# Altium schematic symbol library jlcpcb_2025_04_capacitors_extended_0402.schlib: 3594 symbols (part 4 of 20)
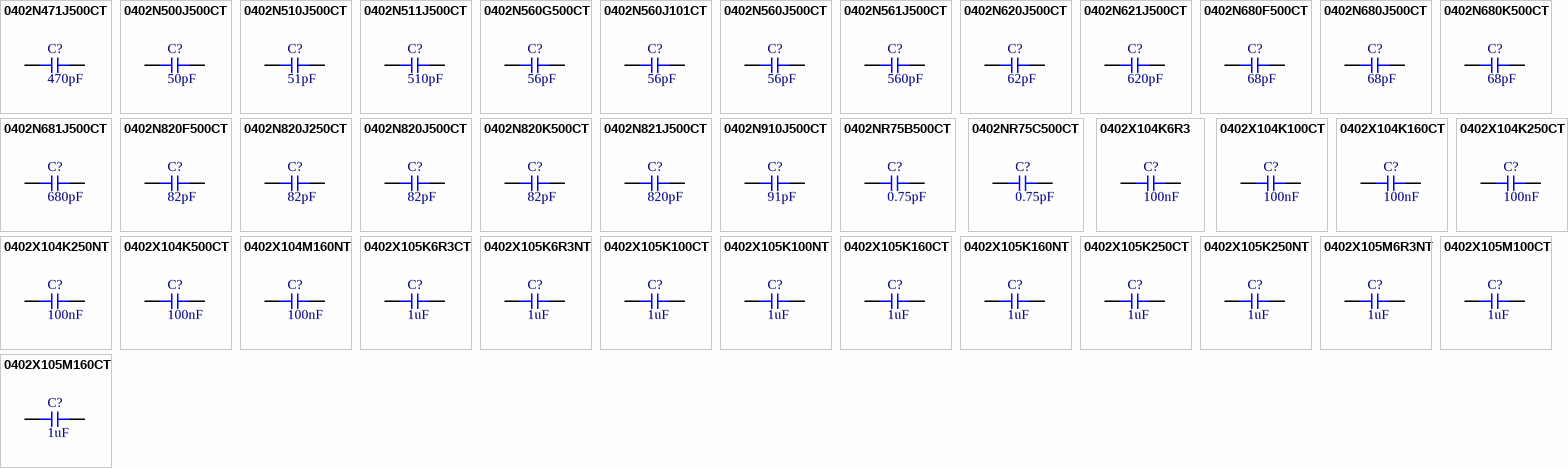
[diagram p92: symbols 0402N471J500CT to 0402X105M160CT]

## 0402X104M160NT
designator C?  Capacitance: 100nF  (hidden comment: *)
Capacitor, Ceramic (MLCC), 100nF, 16V, X5R, SMD 0402; Manufacturer: FH (Guangdong Fenghua Advanced Tech); Manufacturer Part Number: 0402X104M160NT; Package Size: 0402; JLCPCB Basic Part: No; JLCPCB Part Number: C2857973; Supplier 1: LCSC; Category: Capacitors - MLCC; Supplier Part Number 1: C2857973; Voltage Rating: 16V; Temperature Coefficient: X5R; RoHS: Yes; ComponentLink1Description: Datasheet; ComponentLink2Description: JLCPCB Part URL; ComponentLink2URL: https://jlcpcb.com/partdetail/C2857973; ComponentLink3Description: LCSC Part URL; ComponentLink3URL: https://lcsc.com/product-detail/Multilayer-Ceramic-Capacitors-MLCC---SMD-SMT_FH-Guangdong-Fenghua-Advanced-Tech-FH-Guangdong-Fenghua-Advanced-Tech-0402X104M160NT_C2857973.html
footprint CAP-0402 (0402 (1005M) Capacitor)
pins: 1, 2

## 0402X105K6R3CT
designator C?  Capacitance: 1uF  (hidden comment: *)
Capacitor, Ceramic (MLCC), 1uF, ±10%, 6.3V, X5R, ±10%, SMD 0402; Manufacturer: Walsin Tech Corp; Manufacturer Part Number: 0402X105K6R3CT; Package Size: 0402; JLCPCB Basic Part: No; JLCPCB Part Number: C295938; Supplier 1: LCSC; Category: Capacitors - MLCC; Supplier Part Number 1: C295938; Tolerance: ±10%; Voltage Rating: 6.3V; Temperature Coefficient: X5R; RoHS: Yes; ComponentLink1Description: Datasheet; ComponentLink1URL: https://wmsc.lcsc.com/wmsc/upload/file/pdf/v2/lcsc/2304140030_Walsin-Tech-Corp-0402X105K6R3CT_C295938.pdf; ComponentLink2Description: JLCPCB Part URL; ComponentLink2URL: https://jlcpcb.com/partdetail/C295938; ComponentLink3Description: LCSC Part URL; ComponentLink3URL: https://lcsc.com/product-detail/Multilayer-Ceramic-Capacitors-MLCC---SMD-SMT_Walsin-Tech-Corp-Walsin-Tech-Corp-0402X105K6R3CT_C295938.html
footprint CAP-0402 (0402 (1005M) Capacitor)
pins: 1, 2

## 0402X105K6R3NT
designator C?  Capacitance: 1uF  (hidden comment: *)
Capacitor, Ceramic (MLCC), 1uF, ±10%, 6.3V, X5R, ±10%, SMD 0402; Manufacturer: FH(Guangdong Fenghua Advanced Tech); Manufacturer Part Number: 0402X105K6R3NT; Package Size: 0402; JLCPCB Basic Part: No; JLCPCB Part Number: C142376; Supplier 1: LCSC; Category: Capacitors - MLCC; Supplier Part Number 1: C142376; Tolerance: ±10%; Voltage Rating: 6.3V; Temperature Coefficient: X5R; RoHS: Yes; ComponentLink1Description: Datasheet; ComponentLink1URL: https://wmsc.lcsc.com/wmsc/upload/file/pdf/v2/lcsc/2304140030_FH--Guangdong-Fenghua-Advanced-Tech-0402X105K6R3NT_C142376.pdf; ComponentLink2Description: JLCPCB Part URL; ComponentLink2URL: https://jlcpcb.com/partdetail/C142376; ComponentLink3Description: LCSC Part URL; ComponentLink3URL: https://lcsc.com/product-detail/Multilayer-Ceramic-Capacitors-MLCC---SMD-SMT_FH-Guangdong-Fenghua-Advanced-Tech-FH-Guangdong-Fenghua-Advanced-Tech-0402X105K6R3NT_C142376.html
footprint CAP-0402 (0402 (1005M) Capacitor)
pins: 1, 2

## 0402X105K100CT
designator C?  Capacitance: 1uF  (hidden comment: *)
Capacitor, Ceramic (MLCC), 1uF, ±10%, 10V, X5R, ±10%, SMD 0402; Manufacturer: Walsin Tech Corp; Manufacturer Part Number: 0402X105K100CT; Package Size: 0402; JLCPCB Basic Part: No; JLCPCB Part Number: C164868; Supplier 1: LCSC; Category: Capacitors - MLCC; Supplier Part Number 1: C164868; Tolerance: ±10%; Voltage Rating: 10V; Temperature Coefficient: X5R; RoHS: Yes; ComponentLink1Description: Datasheet; ComponentLink1URL: https://wmsc.lcsc.com/wmsc/upload/file/pdf/v2/lcsc/2304140030_Walsin-Tech-Corp-0402X105K100CT_C164868.pdf; ComponentLink2Description: JLCPCB Part URL; ComponentLink2URL: https://jlcpcb.com/partdetail/C164868; ComponentLink3Description: LCSC Part URL; ComponentLink3URL: https://lcsc.com/product-detail/Multilayer-Ceramic-Capacitors-MLCC---SMD-SMT_Walsin-Tech-Corp-Walsin-Tech-Corp-0402X105K100CT_C164868.html
footprint CAP-0402 (0402 (1005M) Capacitor)
pins: 1, 2

## 0402X105K100NT
designator C?  Capacitance: 1uF  (hidden comment: *)
Capacitor, Ceramic (MLCC), 1uF, ±10%, 10V, X5R, ±10%, SMD 0402; Manufacturer: FH(Guangdong Fenghua Advanced Tech); Manufacturer Part Number: 0402X105K100NT; Package Size: 0402; JLCPCB Basic Part: No; JLCPCB Part Number: C157353; Supplier 1: LCSC; Category: Capacitors - MLCC; Supplier Part Number 1: C157353; Tolerance: ±10%; Voltage Rating: 10V; Temperature Coefficient: X5R; RoHS: Yes; ComponentLink1Description: Datasheet; ComponentLink1URL: https://wmsc.lcsc.com/wmsc/upload/file/pdf/v2/lcsc/2304140030_FH--Guangdong-Fenghua-Advanced-Tech-0402X105K100NT_C157353.pdf; ComponentLink2Description: JLCPCB Part URL; ComponentLink2URL: https://jlcpcb.com/partdetail/C157353; ComponentLink3Description: LCSC Part URL; ComponentLink3URL: https://lcsc.com/product-detail/Multilayer-Ceramic-Capacitors-MLCC---SMD-SMT_FH-Guangdong-Fenghua-Advanced-Tech-FH-Guangdong-Fenghua-Advanced-Tech-0402X105K100NT_C157353.html
footprint CAP-0402 (0402 (1005M) Capacitor)
pins: 1, 2

## 0402X105K160CT
designator C?  Capacitance: 1uF  (hidden comment: *)
Capacitor, Ceramic (MLCC), 1uF, ±10%, 16V, X5R, ±10%, SMD 0402; Manufacturer: Walsin Tech Corp; Manufacturer Part Number: 0402X105K160CT; Package Size: 0402; JLCPCB Basic Part: No; JLCPCB Part Number: C83063; Supplier 1: LCSC; Category: Capacitors - MLCC; Supplier Part Number 1: C83063; Tolerance: ±10%; Voltage Rating: 16V; Temperature Coefficient: X5R; RoHS: Yes; ComponentLink1Description: Datasheet; ComponentLink1URL: https://wmsc.lcsc.com/wmsc/upload/file/pdf/v2/lcsc/2304140030_Walsin-Tech-Corp-0402X105K160CT_C83063.pdf; ComponentLink2Description: JLCPCB Part URL; ComponentLink2URL: https://jlcpcb.com/partdetail/C83063; ComponentLink3Description: LCSC Part URL; ComponentLink3URL: https://lcsc.com/product-detail/Multilayer-Ceramic-Capacitors-MLCC---SMD-SMT_Walsin-Tech-Corp-Walsin-Tech-Corp-0402X105K160CT_C83063.html
footprint CAP-0402 (0402 (1005M) Capacitor)
pins: 1, 2

## 0402X105K160NT
designator C?  Capacitance: 1uF  (hidden comment: *)
Capacitor, Ceramic (MLCC), 1uF, ±10%, 16V, X5R, ±10%, SMD 0402; Manufacturer: FH(Guangdong Fenghua Advanced Tech); Manufacturer Part Number: 0402X105K160NT; Package Size: 0402; JLCPCB Basic Part: No; JLCPCB Part Number: C167339; Supplier 1: LCSC; Category: Capacitors - MLCC; Supplier Part Number 1: C167339; Tolerance: ±10%; Voltage Rating: 16V; Temperature Coefficient: X5R; RoHS: Yes; ComponentLink1Description: Datasheet; ComponentLink1URL: https://wmsc.lcsc.com/wmsc/upload/file/pdf/v2/lcsc/2304140030_FH--Guangdong-Fenghua-Advanced-Tech-0402X105K160NT_C167339.pdf; ComponentLink2Description: JLCPCB Part URL; ComponentLink2URL: https://jlcpcb.com/partdetail/C167339; ComponentLink3Description: LCSC Part URL; ComponentLink3URL: https://lcsc.com/product-detail/Multilayer-Ceramic-Capacitors-MLCC---SMD-SMT_FH-Guangdong-Fenghua-Advanced-Tech-FH-Guangdong-Fenghua-Advanced-Tech-0402X105K160NT_C167339.html
footprint CAP-0402 (0402 (1005M) Capacitor)
pins: 1, 2

## 0402X105K250CT
designator C?  Capacitance: 1uF  (hidden comment: *)
Capacitor, Ceramic (MLCC), 1uF, ±10%, 25V, X5R, ±10%, SMD 0402; Manufacturer: Walsin Tech Corp; Manufacturer Part Number: 0402X105K250CT; Package Size: 0402; JLCPCB Basic Part: No; JLCPCB Part Number: C237173; Supplier 1: LCSC; Category: Capacitors - MLCC; Supplier Part Number 1: C237173; Tolerance: ±10%; Voltage Rating: 25V; Temperature Coefficient: X5R; RoHS: Yes; ComponentLink1Description: Datasheet; ComponentLink1URL: https://wmsc.lcsc.com/wmsc/upload/file/pdf/v2/lcsc/2304140030_Walsin-Tech-Corp-0402X105K250CT_C237173.pdf; ComponentLink2Description: JLCPCB Part URL; ComponentLink2URL: https://jlcpcb.com/partdetail/C237173; ComponentLink3Description: LCSC Part URL; ComponentLink3URL: https://lcsc.com/product-detail/Multilayer-Ceramic-Capacitors-MLCC---SMD-SMT_Walsin-Tech-Corp-Walsin-Tech-Corp-0402X105K250CT_C237173.html
footprint CAP-0402 (0402 (1005M) Capacitor)
pins: 1, 2

## 0402X105K250NT
designator C?  Capacitance: 1uF  (hidden comment: *)
Capacitor, Ceramic (MLCC), 1uF, ±10%, 25V, ±10%, SMD 0402; Manufacturer: FH(Guangdong Fenghua Advanced Tech); Manufacturer Part Number: 0402X105K250NT; Package Size: 0402; JLCPCB Basic Part: No; JLCPCB Part Number: C967571; Supplier 1: LCSC; Category: Capacitors - MLCC; Supplier Part Number 1: C967571; Tolerance: ±10%; Voltage Rating: 25V; RoHS: Yes; ComponentLink1Description: Datasheet; ComponentLink1URL: https://wmsc.lcsc.com/wmsc/upload/file/pdf/v2/lcsc/2304140030_FH--Guangdong-Fenghua-Advanced-Tech-0402X105K250NT_C967571.pdf; ComponentLink2Description: JLCPCB Part URL; ComponentLink2URL: https://jlcpcb.com/partdetail/C967571; ComponentLink3Description: LCSC Part URL; ComponentLink3URL: https://lcsc.com/product-detail/Multilayer-Ceramic-Capacitors-MLCC---SMD-SMT_FH-Guangdong-Fenghua-Advanced-Tech-FH-Guangdong-Fenghua-Advanced-Tech-0402X105K250NT_C967571.html
footprint CAP-0402 (0402 (1005M) Capacitor)
pins: 1, 2

## 0402X105M6R3NT
designator C?  Capacitance: 1uF  (hidden comment: *)
Capacitor, Ceramic (MLCC), 1uF, ±20%, 6.3V, X5R, ±20%, SMD 0402; Manufacturer: FH(Guangdong Fenghua Advanced Tech); Manufacturer Part Number: 0402X105M6R3NT; Package Size: 0402; JLCPCB Basic Part: No; JLCPCB Part Number: C301999; Supplier 1: LCSC; Category: Capacitors - MLCC; Supplier Part Number 1: C301999; Tolerance: ±20%; Voltage Rating: 6.3V; Temperature Coefficient: X5R; RoHS: Yes; ComponentLink1Description: Datasheet; ComponentLink1URL: https://wmsc.lcsc.com/wmsc/upload/file/pdf/v2/lcsc/2304140030_FH--Guangdong-Fenghua-Advanced-Tech-0402X105M6R3NT_C301999.pdf; ComponentLink2Description: JLCPCB Part URL; ComponentLink2URL: https://jlcpcb.com/partdetail/C301999; ComponentLink3Description: LCSC Part URL; ComponentLink3URL: https://lcsc.com/product-detail/Multilayer-Ceramic-Capacitors-MLCC---SMD-SMT_FH-Guangdong-Fenghua-Advanced-Tech-FH-Guangdong-Fenghua-Advanced-Tech-0402X105M6R3NT_C301999.html
footprint CAP-0402 (0402 (1005M) Capacitor)
pins: 1, 2

## 0402X105M100CT
designator C?  Capacitance: 1uF  (hidden comment: *)
Capacitor, Ceramic (MLCC), 1uF, ±20%, 10V, X5R, ±20%, SMD 0402; Manufacturer: Walsin Tech Corp; Manufacturer Part Number: 0402X105M100CT; Package Size: 0402; JLCPCB Basic Part: No; JLCPCB Part Number: C387960; Supplier 1: LCSC; Category: Capacitors - MLCC; Supplier Part Number 1: C387960; Tolerance: ±20%; Voltage Rating: 10V; Temperature Coefficient: X5R; RoHS: Yes; ComponentLink1Description: Datasheet; ComponentLink1URL: https://wmsc.lcsc.com/wmsc/upload/file/pdf/v2/lcsc/2304140030_Walsin-Tech-Corp-0402X105M100CT_C387960.pdf; ComponentLink2Description: JLCPCB Part URL; ComponentLink2URL: https://jlcpcb.com/partdetail/C387960; ComponentLink3Description: LCSC Part URL; ComponentLink3URL: https://lcsc.com/product-detail/Multilayer-Ceramic-Capacitors-MLCC---SMD-SMT_Walsin-Tech-Corp-Walsin-Tech-Corp-0402X105M100CT_C387960.html
footprint CAP-0402 (0402 (1005M) Capacitor)
pins: 1, 2

## 0402X105M160CT
designator C?  Capacitance: 1uF  (hidden comment: *)
Capacitor, Ceramic (MLCC), 1uF, ±20%, 16V, X5R, ±20%, SMD 0402; Manufacturer: Walsin Tech Corp; Manufacturer Part Number: 0402X105M160CT; Package Size: 0402; JLCPCB Basic Part: No; JLCPCB Part Number: C3889771; Supplier 1: LCSC; Category: Capacitors - MLCC; Supplier Part Number 1: C3889771; Tolerance: ±20%; Voltage Rating: 16V; Temperature Coefficient: X5R; RoHS: Yes; ComponentLink1Description: Datasheet; ComponentLink1URL: https://wmsc.lcsc.com/wmsc/upload/file/pdf/v2/lcsc/2309201534_Walsin-Tech-Corp-0402X105M160CT_C3889771.pdf; ComponentLink2Description: JLCPCB Part URL; ComponentLink2URL: https://jlcpcb.com/partdetail/C3889771; ComponentLink3Description: LCSC Part URL; ComponentLink3URL: https://lcsc.com/product-detail/Multilayer-Ceramic-Capacitors-MLCC---SMD-SMT_Walsin-Tech-Corp-Walsin-Tech-Corp-0402X105M160CT_C3889771.html
footprint CAP-0402 (0402 (1005M) Capacitor)
pins: 1, 2

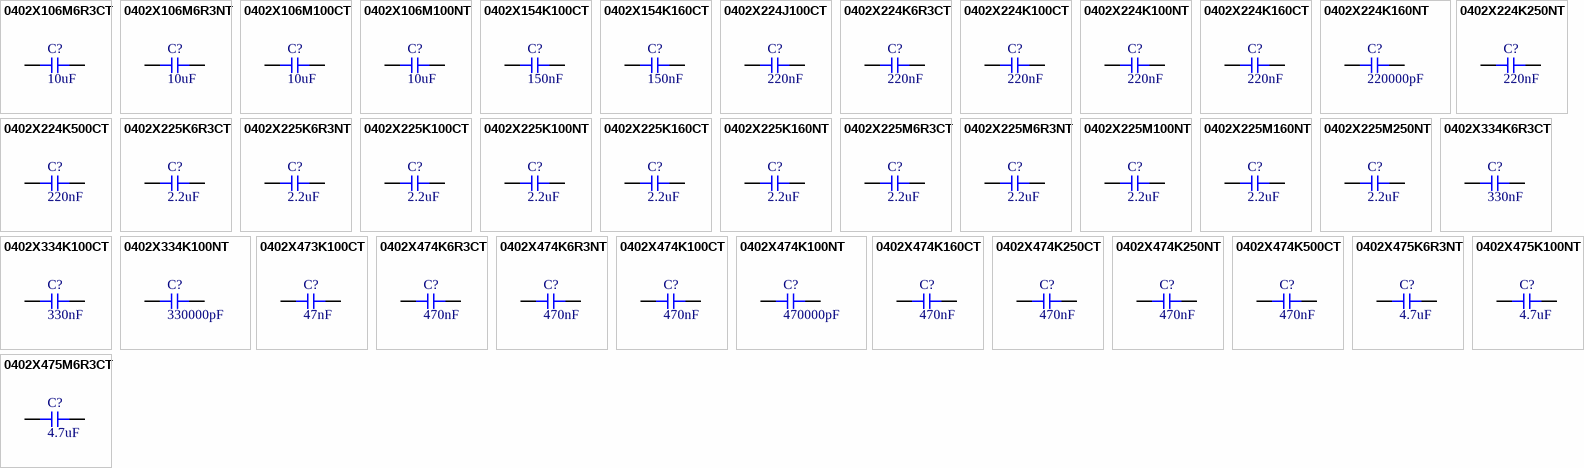
[diagram p14: symbols 0402X106M6R3CT to 0402X475M6R3CT]

## 0402X106M6R3CT
designator C?  Capacitance: 10uF  (hidden comment: *)
Capacitor, Ceramic (MLCC), 10uF, ±20%, 6.3V, X5R, ±20%, SMD 0402; Manufacturer: Walsin Tech Corp; Manufacturer Part Number: 0402X106M6R3CT; Package Size: 0402; JLCPCB Basic Part: No; JLCPCB Part Number: C106833; Supplier 1: LCSC; Category: Capacitors - MLCC; Supplier Part Number 1: C106833; Tolerance: ±20%; Voltage Rating: 6.3V; Temperature Coefficient: X5R; RoHS: Yes; ComponentLink1Description: Datasheet; ComponentLink1URL: https://wmsc.lcsc.com/wmsc/upload/file/pdf/v2/lcsc/2304140030_Walsin-Tech-Corp-0402X106M6R3CT_C106833.pdf; ComponentLink2Description: JLCPCB Part URL; ComponentLink2URL: https://jlcpcb.com/partdetail/C106833; ComponentLink3Description: LCSC Part URL; ComponentLink3URL: https://lcsc.com/product-detail/Multilayer-Ceramic-Capacitors-MLCC---SMD-SMT_Walsin-Tech-Corp-Walsin-Tech-Corp-0402X106M6R3CT_C106833.html
footprint CAP-0402 (0402 (1005M) Capacitor)
pins: 1, 2

## 0402X106M6R3NT
designator C?  Capacitance: 10uF  (hidden comment: *)
Capacitor, Ceramic (MLCC), 10uF, ±20%, 6.3V, X5R, ±20%, SMD 0402; Manufacturer: FH(Guangdong Fenghua Advanced Tech); Manufacturer Part Number: 0402X106M6R3NT; Package Size: 0402; JLCPCB Basic Part: No; JLCPCB Part Number: C163694; Supplier 1: LCSC; Category: Capacitors - MLCC; Supplier Part Number 1: C163694; Tolerance: ±20%; Voltage Rating: 6.3V; Temperature Coefficient: X5R; RoHS: Yes; ComponentLink1Description: Datasheet; ComponentLink1URL: https://wmsc.lcsc.com/wmsc/upload/file/pdf/v2/lcsc/2202140030_FH--Guangdong-Fenghua-Advanced-Tech-0402X106M6R3NT_C163694.pdf; ComponentLink2Description: JLCPCB Part URL; ComponentLink2URL: https://jlcpcb.com/partdetail/C163694; ComponentLink3Description: LCSC Part URL; ComponentLink3URL: https://lcsc.com/product-detail/Multilayer-Ceramic-Capacitors-MLCC---SMD-SMT_FH-Guangdong-Fenghua-Advanced-Tech-FH-Guangdong-Fenghua-Advanced-Tech-0402X106M6R3NT_C163694.html
footprint CAP-0402 (0402 (1005M) Capacitor)
pins: 1, 2

## 0402X106M100CT
designator C?  Capacitance: 10uF  (hidden comment: *)
Capacitor, Ceramic (MLCC), 10uF, ±20%, 10V, X5R, ±20%, SMD 0402; Manufacturer: Walsin Tech Corp; Manufacturer Part Number: 0402X106M100CT; Package Size: 0402; JLCPCB Basic Part: No; JLCPCB Part Number: C2992625; Supplier 1: LCSC; Category: Capacitors - MLCC; Supplier Part Number 1: C2992625; Tolerance: ±20%; Voltage Rating: 10V; Temperature Coefficient: X5R; RoHS: Yes; ComponentLink1Description: Datasheet; ComponentLink1URL: https://wmsc.lcsc.com/wmsc/upload/file/pdf/v2/lcsc/2204121445_Walsin-Tech-Corp-0402X106M100CT_C2992625.pdf; ComponentLink2Description: JLCPCB Part URL; ComponentLink2URL: https://jlcpcb.com/partdetail/C2992625; ComponentLink3Description: LCSC Part URL; ComponentLink3URL: https://lcsc.com/product-detail/Multilayer-Ceramic-Capacitors-MLCC---SMD-SMT_Walsin-Tech-Corp-Walsin-Tech-Corp-0402X106M100CT_C2992625.html
footprint CAP-0402 (0402 (1005M) Capacitor)
pins: 1, 2

## 0402X106M100NT
designator C?  Capacitance: 10uF  (hidden comment: *)
Capacitor, Ceramic (MLCC), 10uF, ±20%, 10V, ±20%, SMD 0402; Manufacturer: FH(Guangdong Fenghua Advanced Tech); Manufacturer Part Number: 0402X106M100NT; Package Size: 0402; JLCPCB Basic Part: No; JLCPCB Part Number: C2846677; Supplier 1: LCSC; Category: Capacitors - MLCC; Supplier Part Number 1: C2846677; Tolerance: ±20%; Voltage Rating: 10V; RoHS: Yes; ComponentLink1Description: Datasheet; ComponentLink1URL: https://wmsc.lcsc.com/wmsc/upload/file/pdf/v2/lcsc/2209261001_FH--Guangdong-Fenghua-Advanced-Tech-0402X106M100NT_C2846677.pdf; ComponentLink2Description: JLCPCB Part URL; ComponentLink2URL: https://jlcpcb.com/partdetail/C2846677; ComponentLink3Description: LCSC Part URL; ComponentLink3URL: https://lcsc.com/product-detail/Multilayer-Ceramic-Capacitors-MLCC---SMD-SMT_FH-Guangdong-Fenghua-Advanced-Tech-FH-Guangdong-Fenghua-Advanced-Tech-0402X106M100NT_C2846677.html
footprint CAP-0402 (0402 (1005M) Capacitor)
pins: 1, 2

## 0402X154K100CT
designator C?  Capacitance: 150nF  (hidden comment: *)
Capacitor, Ceramic (MLCC), 150nF, ±10%, 10V, X5R, ±10%, SMD 0402; Manufacturer: Walsin Tech Corp; Manufacturer Part Number: 0402X154K100CT; Package Size: 0402; JLCPCB Basic Part: No; JLCPCB Part Number: C387961; Supplier 1: LCSC; Category: Capacitors - MLCC; Supplier Part Number 1: C387961; Tolerance: ±10%; Voltage Rating: 10V; Temperature Coefficient: X5R; RoHS: Yes; ComponentLink1Description: Datasheet; ComponentLink1URL: https://wmsc.lcsc.com/wmsc/upload/file/pdf/v2/lcsc/2304140030_Walsin-Tech-Corp-0402X154K100CT_C387961.pdf; ComponentLink2Description: JLCPCB Part URL; ComponentLink2URL: https://jlcpcb.com/partdetail/C387961; ComponentLink3Description: LCSC Part URL; ComponentLink3URL: https://lcsc.com/product-detail/Multilayer-Ceramic-Capacitors-MLCC---SMD-SMT_Walsin-Tech-Corp-Walsin-Tech-Corp-0402X154K100CT_C387961.html
footprint CAP-0402 (0402 (1005M) Capacitor)
pins: 1, 2

## 0402X154K160CT
designator C?  Capacitance: 150nF  (hidden comment: *)
Capacitor, Ceramic (MLCC), 150nF, 16V, X5R, SMD 0402; Manufacturer: Walsin Tech Corp; Manufacturer Part Number: 0402X154K160CT; Package Size: 0402; JLCPCB Basic Part: No; JLCPCB Part Number: C2894186; Supplier 1: LCSC; Category: Capacitors - MLCC; Supplier Part Number 1: C2894186; Voltage Rating: 16V; Temperature Coefficient: X5R; RoHS: Yes; ComponentLink1Description: Datasheet; ComponentLink1URL: https://wmsc.lcsc.com/wmsc/upload/file/pdf/v2/lcsc/2109081830_Walsin-Tech-Corp-0402X154K160CT_C2894186.pdf; ComponentLink2Description: JLCPCB Part URL; ComponentLink2URL: https://jlcpcb.com/partdetail/C2894186; ComponentLink3Description: LCSC Part URL; ComponentLink3URL: https://lcsc.com/product-detail/Multilayer-Ceramic-Capacitors-MLCC---SMD-SMT_Walsin-Tech-Corp-Walsin-Tech-Corp-0402X154K160CT_C2894186.html
footprint CAP-0402 (0402 (1005M) Capacitor)
pins: 1, 2

## 0402X224J100CT
designator C?  Capacitance: 220nF  (hidden comment: *)
Capacitor, Ceramic (MLCC), 220nF, ±5%, 10V, X5R, ±5%, SMD 0402; Manufacturer: Walsin Tech Corp; Manufacturer Part Number: 0402X224J100CT; Package Size: 0402; JLCPCB Basic Part: No; JLCPCB Part Number: C295939; Supplier 1: LCSC; Category: Capacitors - MLCC; Supplier Part Number 1: C295939; Tolerance: ±5%; Voltage Rating: 10V; Temperature Coefficient: X5R; RoHS: Yes; ComponentLink1Description: Datasheet; ComponentLink1URL: https://wmsc.lcsc.com/wmsc/upload/file/pdf/v2/lcsc/2304140030_Walsin-Tech-Corp-0402X224J100CT_C295939.pdf; ComponentLink2Description: JLCPCB Part URL; ComponentLink2URL: https://jlcpcb.com/partdetail/C295939; ComponentLink3Description: LCSC Part URL; ComponentLink3URL: https://lcsc.com/product-detail/Multilayer-Ceramic-Capacitors-MLCC---SMD-SMT_Walsin-Tech-Corp-Walsin-Tech-Corp-0402X224J100CT_C295939.html
footprint CAP-0402 (0402 (1005M) Capacitor)
pins: 1, 2

## 0402X224K6R3CT
designator C?  Capacitance: 220nF  (hidden comment: *)
Capacitor, Ceramic (MLCC), 220nF, ±10%, 6.3V, X5R, ±10%, SMD 0402; Manufacturer: Walsin Tech Corp; Manufacturer Part Number: 0402X224K6R3CT; Package Size: 0402; JLCPCB Basic Part: No; JLCPCB Part Number: C295940; Supplier 1: LCSC; Category: Capacitors - MLCC; Supplier Part Number 1: C295940; Tolerance: ±10%; Voltage Rating: 6.3V; Temperature Coefficient: X5R; RoHS: Yes; ComponentLink1Description: Datasheet; ComponentLink1URL: https://wmsc.lcsc.com/wmsc/upload/file/pdf/v2/lcsc/2304140030_Walsin-Tech-Corp-0402X224K6R3CT_C295940.pdf; ComponentLink2Description: JLCPCB Part URL; ComponentLink2URL: https://jlcpcb.com/partdetail/C295940; ComponentLink3Description: LCSC Part URL; ComponentLink3URL: https://lcsc.com/product-detail/Multilayer-Ceramic-Capacitors-MLCC---SMD-SMT_Walsin-Tech-Corp-Walsin-Tech-Corp-0402X224K6R3CT_C295940.html
footprint CAP-0402 (0402 (1005M) Capacitor)
pins: 1, 2

## 0402X224K100CT
designator C?  Capacitance: 220nF  (hidden comment: *)
Capacitor, Ceramic (MLCC), 220nF, ±10%, 10V, X5R, ±10%, SMD 0402; Manufacturer: Walsin Tech Corp; Manufacturer Part Number: 0402X224K100CT; Package Size: 0402; JLCPCB Basic Part: No; JLCPCB Part Number: C302000; Supplier 1: LCSC; Category: Capacitors - MLCC; Supplier Part Number 1: C302000; Tolerance: ±10%; Voltage Rating: 10V; Temperature Coefficient: X5R; RoHS: Yes; ComponentLink1Description: Datasheet; ComponentLink1URL: https://wmsc.lcsc.com/wmsc/upload/file/pdf/v2/lcsc/2304140030_Walsin-Tech-Corp-0402X224K100CT_C302000.pdf; ComponentLink2Description: JLCPCB Part URL; ComponentLink2URL: https://jlcpcb.com/partdetail/C302000; ComponentLink3Description: LCSC Part URL; ComponentLink3URL: https://lcsc.com/product-detail/Multilayer-Ceramic-Capacitors-MLCC---SMD-SMT_Walsin-Tech-Corp-Walsin-Tech-Corp-0402X224K100CT_C302000.html
footprint CAP-0402 (0402 (1005M) Capacitor)
pins: 1, 2

## 0402X224K100NT
designator C?  Capacitance: 220nF  (hidden comment: *)
Capacitor, Ceramic (MLCC), 220nF, ±10%, 10V, X5R, ±10%, SMD 0402; Manufacturer: FH (Guangdong Fenghua Advanced Tech); Manufacturer Part Number: 0402X224K100NT; Package Size: 0402; JLCPCB Basic Part: No; JLCPCB Part Number: C880414; Supplier 1: LCSC; Category: Capacitors - MLCC; Supplier Part Number 1: C880414; Tolerance: ±10%; Voltage Rating: 10V; Temperature Coefficient: X5R; RoHS: Yes; ComponentLink1Description: Datasheet; ComponentLink1URL: https://wmsc.lcsc.com/wmsc/upload/file/pdf/v2/lcsc/2304140030_FH--Guangdong-Fenghua-Advanced-Tech-0402X224K100NT_C880414.pdf; ComponentLink2Description: JLCPCB Part URL; ComponentLink2URL: https://jlcpcb.com/partdetail/C880414; ComponentLink3Description: LCSC Part URL; ComponentLink3URL: https://lcsc.com/product-detail/Multilayer-Ceramic-Capacitors-MLCC---SMD-SMT_FH-Guangdong-Fenghua-Advanced-Tech-FH-Guangdong-Fenghua-Advanced-Tech-0402X224K100NT_C880414.html
footprint CAP-0402 (0402 (1005M) Capacitor)
pins: 1, 2

## 0402X224K160CT
designator C?  Capacitance: 220nF  (hidden comment: *)
Capacitor, Ceramic (MLCC), 220nF, ±10%, 16V, X5R, ±10%, SMD 0402; Manufacturer: Walsin Tech Corp; Manufacturer Part Number: 0402X224K160CT; Package Size: 0402; JLCPCB Basic Part: No; JLCPCB Part Number: C152777; Supplier 1: LCSC; Category: Capacitors - MLCC; Supplier Part Number 1: C152777; Tolerance: ±10%; Voltage Rating: 16V; Temperature Coefficient: X5R; RoHS: Yes; ComponentLink1Description: Datasheet; ComponentLink1URL: https://wmsc.lcsc.com/wmsc/upload/file/pdf/v2/lcsc/2304140030_Walsin-Tech-Corp-0402X224K160CT_C152777.pdf; ComponentLink2Description: JLCPCB Part URL; ComponentLink2URL: https://jlcpcb.com/partdetail/C152777; ComponentLink3Description: LCSC Part URL; ComponentLink3URL: https://lcsc.com/product-detail/Multilayer-Ceramic-Capacitors-MLCC---SMD-SMT_Walsin-Tech-Corp-Walsin-Tech-Corp-0402X224K160CT_C152777.html
footprint CAP-0402 (0402 (1005M) Capacitor)
pins: 1, 2

## 0402X224K160NT
designator C?  Capacitance: 220000pF  (hidden comment: *)
Capacitor, Ceramic (MLCC), 220000pF, ±10%, 16V, X5R, ±10%, SMD 0402; Manufacturer: FH (Guangdong Fenghua Advanced Tech); Manufacturer Part Number: 0402X224K160NT; Package Size: 0402; JLCPCB Basic Part: No; JLCPCB Part Number: C285193; Supplier 1: LCSC; Category: Capacitors - MLCC; Supplier Part Number 1: C285193; Tolerance: ±10%; Voltage Rating: 16V; Temperature Coefficient: X5R; RoHS: Yes; ComponentLink1Description: Datasheet; ComponentLink1URL: https://wmsc.lcsc.com/wmsc/upload/file/pdf/v2/lcsc/2201041830_FH--Guangdong-Fenghua-Advanced-Tech-0402X224K160NT_C285193.pdf; ComponentLink2Description: JLCPCB Part URL; ComponentLink2URL: https://jlcpcb.com/partdetail/C285193; ComponentLink3Description: LCSC Part URL; ComponentLink3URL: https://lcsc.com/product-detail/Multilayer-Ceramic-Capacitors-MLCC---SMD-SMT_FH-Guangdong-Fenghua-Advanced-Tech-FH-Guangdong-Fenghua-Advanced-Tech-0402X224K160NT_C285193.html
footprint CAP-0402 (0402 (1005M) Capacitor)
pins: 1, 2

## 0402X224K250NT
designator C?  Capacitance: 220nF  (hidden comment: *)
Capacitor, Ceramic (MLCC), 220nF, ±10%, 25V, X5R, ±10%, SMD 0402; Manufacturer: FH (Guangdong Fenghua Advanced Tech); Manufacturer Part Number: 0402X224K250NT; Package Size: 0402; JLCPCB Basic Part: No; JLCPCB Part Number: C2991751; Supplier 1: LCSC; Category: Capacitors - MLCC; Supplier Part Number 1: C2991751; Tolerance: ±10%; Voltage Rating: 25V; Temperature Coefficient: X5R; RoHS: Yes; ComponentLink1Description: Datasheet; ComponentLink1URL: https://wmsc.lcsc.com/wmsc/upload/file/pdf/v2/lcsc/2204111630_FH--Guangdong-Fenghua-Advanced-Tech-0402X224K250NT_C2991751.pdf; ComponentLink2Description: JLCPCB Part URL; ComponentLink2URL: https://jlcpcb.com/partdetail/C2991751; ComponentLink3Description: LCSC Part URL; ComponentLink3URL: https://lcsc.com/product-detail/Multilayer-Ceramic-Capacitors-MLCC---SMD-SMT_FH-Guangdong-Fenghua-Advanced-Tech-FH-Guangdong-Fenghua-Advanced-Tech-0402X224K250NT_C2991751.html
footprint CAP-0402 (0402 (1005M) Capacitor)
pins: 1, 2

## 0402X224K500CT
designator C?  Capacitance: 220nF  (hidden comment: *)
Capacitor, Ceramic (MLCC), 220nF, ±10%, 50V, X5R, ±10%, SMD 0402; Manufacturer: Walsin Tech Corp; Manufacturer Part Number: 0402X224K500CT; Package Size: 0402; JLCPCB Basic Part: No; JLCPCB Part Number: C2992619; Supplier 1: LCSC; Category: Capacitors - MLCC; Supplier Part Number 1: C2992619; Tolerance: ±10%; Voltage Rating: 50V; Temperature Coefficient: X5R; RoHS: Yes; ComponentLink1Description: Datasheet; ComponentLink1URL: https://wmsc.lcsc.com/wmsc/upload/file/pdf/v2/lcsc/2204121445_Walsin-Tech-Corp-0402X224K500CT_C2992619.pdf; ComponentLink2Description: JLCPCB Part URL; ComponentLink2URL: https://jlcpcb.com/partdetail/C2992619; ComponentLink3Description: LCSC Part URL; ComponentLink3URL: https://lcsc.com/product-detail/Multilayer-Ceramic-Capacitors-MLCC---SMD-SMT_Walsin-Tech-Corp-Walsin-Tech-Corp-0402X224K500CT_C2992619.html
footprint CAP-0402 (0402 (1005M) Capacitor)
pins: 1, 2

## 0402X225K6R3CT
designator C?  Capacitance: 2.2uF  (hidden comment: *)
Capacitor, Ceramic (MLCC), 2.2uF, ±10%, 6.3V, X5R, ±10%, SMD 0402; Manufacturer: Walsin Tech Corp; Manufacturer Part Number: 0402X225K6R3CT; Package Size: 0402; JLCPCB Basic Part: No; JLCPCB Part Number: C295942; Supplier 1: LCSC; Category: Capacitors - MLCC; Supplier Part Number 1: C295942; Tolerance: ±10%; Voltage Rating: 6.3V; Temperature Coefficient: X5R; RoHS: Yes; ComponentLink1Description: Datasheet; ComponentLink1URL: https://wmsc.lcsc.com/wmsc/upload/file/pdf/v2/lcsc/2304140030_Walsin-Tech-Corp-0402X225K6R3CT_C295942.pdf; ComponentLink2Description: JLCPCB Part URL; ComponentLink2URL: https://jlcpcb.com/partdetail/C295942; ComponentLink3Description: LCSC Part URL; ComponentLink3URL: https://lcsc.com/product-detail/Multilayer-Ceramic-Capacitors-MLCC---SMD-SMT_Walsin-Tech-Corp-Walsin-Tech-Corp-0402X225K6R3CT_C295942.html
footprint CAP-0402 (0402 (1005M) Capacitor)
pins: 1, 2

## 0402X225K6R3NT
designator C?  Capacitance: 2.2uF  (hidden comment: *)
Capacitor, Ceramic (MLCC), 2.2uF, ±10%, 6.3V, X5R, ±10%, SMD 0402; Manufacturer: FH(Guangdong Fenghua Advanced Tech); Manufacturer Part Number: 0402X225K6R3NT; Package Size: 0402; JLCPCB Basic Part: No; JLCPCB Part Number: C193620; Supplier 1: LCSC; Category: Capacitors - MLCC; Supplier Part Number 1: C193620; Tolerance: ±10%; Voltage Rating: 6.3V; Temperature Coefficient: X5R; RoHS: Yes; ComponentLink1Description: Datasheet; ComponentLink1URL: https://wmsc.lcsc.com/wmsc/upload/file/pdf/v2/lcsc/2304140030_FH--Guangdong-Fenghua-Advanced-Tech-0402X225K6R3NT_C193620.pdf; ComponentLink2Description: JLCPCB Part URL; ComponentLink2URL: https://jlcpcb.com/partdetail/C193620; ComponentLink3Description: LCSC Part URL; ComponentLink3URL: https://lcsc.com/product-detail/Multilayer-Ceramic-Capacitors-MLCC---SMD-SMT_FH-Guangdong-Fenghua-Advanced-Tech-FH-Guangdong-Fenghua-Advanced-Tech-0402X225K6R3NT_C193620.html
footprint CAP-0402 (0402 (1005M) Capacitor)
pins: 1, 2

## 0402X225K100CT
designator C?  Capacitance: 2.2uF  (hidden comment: *)
Capacitor, Ceramic (MLCC), 2.2uF, ±10%, 10V, X5R, ±10%, SMD 0402; Manufacturer: Walsin Tech Corp; Manufacturer Part Number: 0402X225K100CT; Package Size: 0402; JLCPCB Basic Part: No; JLCPCB Part Number: C295941; Supplier 1: LCSC; Category: Capacitors - MLCC; Supplier Part Number 1: C295941; Tolerance: ±10%; Voltage Rating: 10V; Temperature Coefficient: X5R; RoHS: Yes; ComponentLink1Description: Datasheet; ComponentLink1URL: https://wmsc.lcsc.com/wmsc/upload/file/pdf/v2/lcsc/2304140030_Walsin-Tech-Corp-0402X225K100CT_C295941.pdf; ComponentLink2Description: JLCPCB Part URL; ComponentLink2URL: https://jlcpcb.com/partdetail/C295941; ComponentLink3Description: LCSC Part URL; ComponentLink3URL: https://lcsc.com/product-detail/Multilayer-Ceramic-Capacitors-MLCC---SMD-SMT_Walsin-Tech-Corp-Walsin-Tech-Corp-0402X225K100CT_C295941.html
footprint CAP-0402 (0402 (1005M) Capacitor)
pins: 1, 2

## 0402X225K100NT
designator C?  Capacitance: 2.2uF  (hidden comment: *)
Capacitor, Ceramic (MLCC), 2.2uF, ±10%, 10V, X5R, ±10%, SMD 0402; Manufacturer: FH(Guangdong Fenghua Advanced Tech); Manufacturer Part Number: 0402X225K100NT; Package Size: 0402; JLCPCB Basic Part: No; JLCPCB Part Number: C501835; Supplier 1: LCSC; Category: Capacitors - MLCC; Supplier Part Number 1: C501835; Tolerance: ±10%; Voltage Rating: 10V; Temperature Coefficient: X5R; RoHS: Yes; ComponentLink1Description: Datasheet; ComponentLink1URL: https://wmsc.lcsc.com/wmsc/upload/file/pdf/v2/lcsc/2304140030_FH--Guangdong-Fenghua-Advanced-Tech-0402X225K100NT_C501835.pdf; ComponentLink2Description: JLCPCB Part URL; ComponentLink2URL: https://jlcpcb.com/partdetail/C501835; ComponentLink3Description: LCSC Part URL; ComponentLink3URL: https://lcsc.com/product-detail/Multilayer-Ceramic-Capacitors-MLCC---SMD-SMT_FH-Guangdong-Fenghua-Advanced-Tech-FH-Guangdong-Fenghua-Advanced-Tech-0402X225K100NT_C501835.html
footprint CAP-0402 (0402 (1005M) Capacitor)
pins: 1, 2

## 0402X225K160CT
designator C?  Capacitance: 2.2uF  (hidden comment: *)
Capacitor, Ceramic (MLCC), 2.2uF, ±10%, X5R, ±10%, SMD 0402; Manufacturer: Walsin Tech Corp; Manufacturer Part Number: 0402X225K160CT; Package Size: 0402; JLCPCB Basic Part: No; JLCPCB Part Number: C4555496; Supplier 1: LCSC; Category: Capacitors - MLCC; Supplier Part Number 1: C4555496; Tolerance: ±10%; Temperature Coefficient: X5R; RoHS: Yes; ComponentLink1Description: Datasheet; ComponentLink1URL: https://wmsc.lcsc.com/wmsc/upload/file/pdf/v2/lcsc/2207111830_Walsin-Tech-Corp-0402X225K160CT_C4555496.pdf; ComponentLink2Description: JLCPCB Part URL; ComponentLink2URL: https://jlcpcb.com/partdetail/C4555496; ComponentLink3Description: LCSC Part URL; ComponentLink3URL: https://lcsc.com/product-detail/Multilayer-Ceramic-Capacitors-MLCC---SMD-SMT_Walsin-Tech-Corp-Walsin-Tech-Corp-0402X225K160CT_C4555496.html
footprint CAP-0402 (0402 (1005M) Capacitor)
pins: 1, 2

## 0402X225K160NT
designator C?  Capacitance: 2.2uF  (hidden comment: *)
Capacitor, Ceramic (MLCC), 2.2uF, ±10%, 16V, X5R, ±10%, SMD 0402; Manufacturer: FH(Guangdong Fenghua Advanced Tech); Manufacturer Part Number: 0402X225K160NT; Package Size: 0402; JLCPCB Basic Part: No; JLCPCB Part Number: C501836; Supplier 1: LCSC; Category: Capacitors - MLCC; Supplier Part Number 1: C501836; Tolerance: ±10%; Voltage Rating: 16V; Temperature Coefficient: X5R; RoHS: Yes; ComponentLink1Description: Datasheet; ComponentLink1URL: https://wmsc.lcsc.com/wmsc/upload/file/pdf/v2/lcsc/2304140030_FH--Guangdong-Fenghua-Advanced-Tech-0402X225K160NT_C501836.pdf; ComponentLink2Description: JLCPCB Part URL; ComponentLink2URL: https://jlcpcb.com/partdetail/C501836; ComponentLink3Description: LCSC Part URL; ComponentLink3URL: https://lcsc.com/product-detail/Multilayer-Ceramic-Capacitors-MLCC---SMD-SMT_FH-Guangdong-Fenghua-Advanced-Tech-FH-Guangdong-Fenghua-Advanced-Tech-0402X225K160NT_C501836.html
footprint CAP-0402 (0402 (1005M) Capacitor)
pins: 1, 2

## 0402X225M6R3CT
designator C?  Capacitance: 2.2uF  (hidden comment: *)
Capacitor, Ceramic (MLCC), 2.2uF, ±20%, 6.3V, X5R, ±20%, SMD 0402; Manufacturer: Walsin Tech Corp; Manufacturer Part Number: 0402X225M6R3CT; Package Size: 0402; JLCPCB Basic Part: No; JLCPCB Part Number: C295944; Supplier 1: LCSC; Category: Capacitors - MLCC; Supplier Part Number 1: C295944; Tolerance: ±20%; Voltage Rating: 6.3V; Temperature Coefficient: X5R; RoHS: Yes; ComponentLink1Description: Datasheet; ComponentLink1URL: https://wmsc.lcsc.com/wmsc/upload/file/pdf/v2/lcsc/2304140030_Walsin-Tech-Corp-0402X225M6R3CT_C295944.pdf; ComponentLink2Description: JLCPCB Part URL; ComponentLink2URL: https://jlcpcb.com/partdetail/C295944; ComponentLink3Description: LCSC Part URL; ComponentLink3URL: https://lcsc.com/product-detail/Multilayer-Ceramic-Capacitors-MLCC---SMD-SMT_Walsin-Tech-Corp-Walsin-Tech-Corp-0402X225M6R3CT_C295944.html
footprint CAP-0402 (0402 (1005M) Capacitor)
pins: 1, 2

## 0402X225M6R3NT
designator C?  Capacitance: 2.2uF  (hidden comment: *)
Capacitor, Ceramic (MLCC), 2.2uF, ±20%, 6.3V, X5R, ±20%, SMD 0402; Manufacturer: FH(Guangdong Fenghua Advanced Tech); Manufacturer Part Number: 0402X225M6R3NT; Package Size: 0402; JLCPCB Basic Part: No; JLCPCB Part Number: C167330; Supplier 1: LCSC; Category: Capacitors - MLCC; Supplier Part Number 1: C167330; Tolerance: ±20%; Voltage Rating: 6.3V; Temperature Coefficient: X5R; RoHS: Yes; ComponentLink1Description: Datasheet; ComponentLink1URL: https://wmsc.lcsc.com/wmsc/upload/file/pdf/v2/lcsc/2304140030_FH--Guangdong-Fenghua-Advanced-Tech-0402X225M6R3NT_C167330.pdf; ComponentLink2Description: JLCPCB Part URL; ComponentLink2URL: https://jlcpcb.com/partdetail/C167330; ComponentLink3Description: LCSC Part URL; ComponentLink3URL: https://lcsc.com/product-detail/Multilayer-Ceramic-Capacitors-MLCC---SMD-SMT_FH-Guangdong-Fenghua-Advanced-Tech-FH-Guangdong-Fenghua-Advanced-Tech-0402X225M6R3NT_C167330.html
footprint CAP-0402 (0402 (1005M) Capacitor)
pins: 1, 2

## 0402X225M100NT
designator C?  Capacitance: 2.2uF  (hidden comment: *)
Capacitor, Ceramic (MLCC), 2.2uF, ±20%, 10V, X5R, ±20%, SMD 0402; Manufacturer: FH(Guangdong Fenghua Advanced Tech); Manufacturer Part Number: 0402X225M100NT; Package Size: 0402; JLCPCB Basic Part: No; JLCPCB Part Number: C60078; Supplier 1: LCSC; Category: Capacitors - MLCC; Supplier Part Number 1: C60078; Tolerance: ±20%; Voltage Rating: 10V; Temperature Coefficient: X5R; RoHS: Yes; ComponentLink1Description: Datasheet; ComponentLink1URL: https://wmsc.lcsc.com/wmsc/upload/file/pdf/v2/lcsc/2304140030_FH--Guangdong-Fenghua-Advanced-Tech-0402X225M100NT_C60078.pdf; ComponentLink2Description: JLCPCB Part URL; ComponentLink2URL: https://jlcpcb.com/partdetail/C60078; ComponentLink3Description: LCSC Part URL; ComponentLink3URL: https://lcsc.com/product-detail/Multilayer-Ceramic-Capacitors-MLCC---SMD-SMT_FH-Guangdong-Fenghua-Advanced-Tech-FH-Guangdong-Fenghua-Advanced-Tech-0402X225M100NT_C60078.html
footprint CAP-0402 (0402 (1005M) Capacitor)
pins: 1, 2

## 0402X225M160NT
designator C?  Capacitance: 2.2uF  (hidden comment: *)
Capacitor, Ceramic (MLCC), 2.2uF, ±20%, 16V, X5R, ±20%, SMD 0402; Manufacturer: FH(Guangdong Fenghua Advanced Tech); Manufacturer Part Number: 0402X225M160NT; Package Size: 0402; JLCPCB Basic Part: No; JLCPCB Part Number: C501837; Supplier 1: LCSC; Category: Capacitors - MLCC; Supplier Part Number 1: C501837; Tolerance: ±20%; Voltage Rating: 16V; Temperature Coefficient: X5R; RoHS: Yes; ComponentLink1Description: Datasheet; ComponentLink1URL: https://wmsc.lcsc.com/wmsc/upload/file/pdf/v2/lcsc/2304140030_FH--Guangdong-Fenghua-Advanced-Tech-0402X225M160NT_C501837.pdf; ComponentLink2Description: JLCPCB Part URL; ComponentLink2URL: https://jlcpcb.com/partdetail/C501837; ComponentLink3Description: LCSC Part URL; ComponentLink3URL: https://lcsc.com/product-detail/Multilayer-Ceramic-Capacitors-MLCC---SMD-SMT_FH-Guangdong-Fenghua-Advanced-Tech-FH-Guangdong-Fenghua-Advanced-Tech-0402X225M160NT_C501837.html
footprint CAP-0402 (0402 (1005M) Capacitor)
pins: 1, 2

## 0402X225M250NT
designator C?  Capacitance: 2.2uF  (hidden comment: *)
Capacitor, Ceramic (MLCC), 2.2uF, ±20%, 25V, X5R, ±20%, SMD 0402; Manufacturer: FH (Guangdong Fenghua Advanced Tech); Manufacturer Part Number: 0402X225M250NT; Package Size: 0402; JLCPCB Basic Part: No; JLCPCB Part Number: C5445360; Supplier 1: LCSC; Category: Capacitors - MLCC; Supplier Part Number 1: C5445360; Tolerance: ±20%; Voltage Rating: 25V; Temperature Coefficient: X5R; RoHS: Yes; ComponentLink1Description: Datasheet; ComponentLink2Description: JLCPCB Part URL; ComponentLink2URL: https://jlcpcb.com/partdetail/C5445360; ComponentLink3Description: LCSC Part URL; ComponentLink3URL: https://lcsc.com/product-detail/Multilayer-Ceramic-Capacitors-MLCC---SMD-SMT_FH-Guangdong-Fenghua-Advanced-Tech-FH-Guangdong-Fenghua-Advanced-Tech-0402X225M250NT_C5445360.html
footprint CAP-0402 (0402 (1005M) Capacitor)
pins: 1, 2

## 0402X334K6R3CT
designator C?  Capacitance: 330nF  (hidden comment: *)
Capacitor, Ceramic (MLCC), 330nF, ±10%, 6.3V, X5R, ±10%, SMD 0402; Manufacturer: Walsin Tech Corp; Manufacturer Part Number: 0402X334K6R3CT; Package Size: 0402; JLCPCB Basic Part: No; JLCPCB Part Number: C295945; Supplier 1: LCSC; Category: Capacitors - MLCC; Supplier Part Number 1: C295945; Tolerance: ±10%; Voltage Rating: 6.3V; Temperature Coefficient: X5R; RoHS: Yes; ComponentLink1Description: Datasheet; ComponentLink1URL: https://wmsc.lcsc.com/wmsc/upload/file/pdf/v2/lcsc/2304140030_Walsin-Tech-Corp-0402X334K6R3CT_C295945.pdf; ComponentLink2Description: JLCPCB Part URL; ComponentLink2URL: https://jlcpcb.com/partdetail/C295945; ComponentLink3Description: LCSC Part URL; ComponentLink3URL: https://lcsc.com/product-detail/Multilayer-Ceramic-Capacitors-MLCC---SMD-SMT_Walsin-Tech-Corp-Walsin-Tech-Corp-0402X334K6R3CT_C295945.html
footprint CAP-0402 (0402 (1005M) Capacitor)
pins: 1, 2

## 0402X334K100CT
designator C?  Capacitance: 330nF  (hidden comment: *)
Capacitor, Ceramic (MLCC), 330nF, ±10%, 10V, X5R, ±10%, SMD 0402; Manufacturer: Walsin Tech Corp; Manufacturer Part Number: 0402X334K100CT; Package Size: 0402; JLCPCB Basic Part: No; JLCPCB Part Number: C123496; Supplier 1: LCSC; Category: Capacitors - MLCC; Supplier Part Number 1: C123496; Tolerance: ±10%; Voltage Rating: 10V; Temperature Coefficient: X5R; RoHS: Yes; ComponentLink1Description: Datasheet; ComponentLink1URL: https://wmsc.lcsc.com/wmsc/upload/file/pdf/v2/lcsc/2304140030_Walsin-Tech-Corp-0402X334K100CT_C123496.pdf; ComponentLink2Description: JLCPCB Part URL; ComponentLink2URL: https://jlcpcb.com/partdetail/C123496; ComponentLink3Description: LCSC Part URL; ComponentLink3URL: https://lcsc.com/product-detail/Multilayer-Ceramic-Capacitors-MLCC---SMD-SMT_Walsin-Tech-Corp-Walsin-Tech-Corp-0402X334K100CT_C123496.html
footprint CAP-0402 (0402 (1005M) Capacitor)
pins: 1, 2

## 0402X334K100NT
designator C?  Capacitance: 330000pF  (hidden comment: *)
Capacitor, Ceramic (MLCC), 330000pF, ±10%, 10V, X5R, ±10%, SMD 0402; Manufacturer: FH (Guangdong Fenghua Advanced Tech); Manufacturer Part Number: 0402X334K100NT; Package Size: 0402; JLCPCB Basic Part: No; JLCPCB Part Number: C880277; Supplier 1: LCSC; Category: Capacitors - MLCC; Supplier Part Number 1: C880277; Tolerance: ±10%; Voltage Rating: 10V; Temperature Coefficient: X5R; RoHS: Yes; ComponentLink1Description: Datasheet; ComponentLink1URL: https://wmsc.lcsc.com/wmsc/upload/file/pdf/v2/lcsc/2304140030_FH--Guangdong-Fenghua-Advanced-Tech-0402X334K100NT_C880277.pdf; ComponentLink2Description: JLCPCB Part URL; ComponentLink2URL: https://jlcpcb.com/partdetail/C880277; ComponentLink3Description: LCSC Part URL; ComponentLink3URL: https://lcsc.com/product-detail/Multilayer-Ceramic-Capacitors-MLCC---SMD-SMT_FH-Guangdong-Fenghua-Advanced-Tech-FH-Guangdong-Fenghua-Advanced-Tech-0402X334K100NT_C880277.html
footprint CAP-0402 (0402 (1005M) Capacitor)
pins: 1, 2

## 0402X473K100CT
designator C?  Capacitance: 47nF  (hidden comment: *)
Capacitor, Ceramic (MLCC), 47nF, ±10%, 10V, X5R, ±10%, SMD 0402; Manufacturer: Walsin Tech Corp; Manufacturer Part Number: 0402X473K100CT; Package Size: 0402; JLCPCB Basic Part: No; JLCPCB Part Number: C458872; Supplier 1: LCSC; Category: Capacitors - MLCC; Supplier Part Number 1: C458872; Tolerance: ±10%; Voltage Rating: 10V; Temperature Coefficient: X5R; RoHS: Yes; ComponentLink1Description: Datasheet; ComponentLink1URL: https://wmsc.lcsc.com/wmsc/upload/file/pdf/v2/lcsc/2304140030_Walsin-Tech-Corp-0402X473K100CT_C458872.pdf; ComponentLink2Description: JLCPCB Part URL; ComponentLink2URL: https://jlcpcb.com/partdetail/C458872; ComponentLink3Description: LCSC Part URL; ComponentLink3URL: https://lcsc.com/product-detail/Multilayer-Ceramic-Capacitors-MLCC---SMD-SMT_Walsin-Tech-Corp-Walsin-Tech-Corp-0402X473K100CT_C458872.html
footprint CAP-0402 (0402 (1005M) Capacitor)
pins: 1, 2

## 0402X474K6R3CT
designator C?  Capacitance: 470nF  (hidden comment: *)
Capacitor, Ceramic (MLCC), 470nF, ±10%, 6.3V, X5R, ±10%, SMD 0402; Manufacturer: Walsin Tech Corp; Manufacturer Part Number: 0402X474K6R3CT; Package Size: 0402; JLCPCB Basic Part: No; JLCPCB Part Number: C123497; Supplier 1: LCSC; Category: Capacitors - MLCC; Supplier Part Number 1: C123497; Tolerance: ±10%; Voltage Rating: 6.3V; Temperature Coefficient: X5R; RoHS: Yes; ComponentLink1Description: Datasheet; ComponentLink1URL: https://wmsc.lcsc.com/wmsc/upload/file/pdf/v2/lcsc/2304140030_Walsin-Tech-Corp-0402X474K6R3CT_C123497.pdf; ComponentLink2Description: JLCPCB Part URL; ComponentLink2URL: https://jlcpcb.com/partdetail/C123497; ComponentLink3Description: LCSC Part URL; ComponentLink3URL: https://lcsc.com/product-detail/Multilayer-Ceramic-Capacitors-MLCC---SMD-SMT_Walsin-Tech-Corp-Walsin-Tech-Corp-0402X474K6R3CT_C123497.html
footprint CAP-0402 (0402 (1005M) Capacitor)
pins: 1, 2

## 0402X474K6R3NT
designator C?  Capacitance: 470nF  (hidden comment: *)
Capacitor, Ceramic (MLCC), 470nF, ±10%, 6.3V, X5R, ±10%, SMD 0402; Manufacturer: FH (Guangdong Fenghua Advanced Tech); Manufacturer Part Number: 0402X474K6R3NT; Package Size: 0402; JLCPCB Basic Part: No; JLCPCB Part Number: C2991651; Supplier 1: LCSC; Category: Capacitors - MLCC; Supplier Part Number 1: C2991651; Tolerance: ±10%; Voltage Rating: 6.3V; Temperature Coefficient: X5R; RoHS: Yes; ComponentLink1Description: Datasheet; ComponentLink1URL: https://wmsc.lcsc.com/wmsc/upload/file/pdf/v2/lcsc/2204111630_FH--Guangdong-Fenghua-Advanced-Tech-0402X474K6R3NT_C2991651.pdf; ComponentLink2Description: JLCPCB Part URL; ComponentLink2URL: https://jlcpcb.com/partdetail/C2991651; ComponentLink3Description: LCSC Part URL; ComponentLink3URL: https://lcsc.com/product-detail/Multilayer-Ceramic-Capacitors-MLCC---SMD-SMT_FH-Guangdong-Fenghua-Advanced-Tech-FH-Guangdong-Fenghua-Advanced-Tech-0402X474K6R3NT_C2991651.html
footprint CAP-0402 (0402 (1005M) Capacitor)
pins: 1, 2
